# Altium integrated library komponenty_ITS_v1.IntLib: 126 symbols (continued)
## LED_0603_BLUE_A001 (continued)

## LED_0603_GREEN_A001
designator D?, comment GR
LED 0603 Green , regular; ITSN: LED_0603_GREEN_A001
footprint 0603_LED_GR (0603 LED Green)
pins: 1 A, 2 K

## LED_0603_RED_A001
designator D?, comment RD
LED 0603 Red , regular; ITSN: LED_0603_RED_A001
footprint 0603_LED_RD (0603 LED Red)
pins: 1 A, 2 K

## LED_0603_YELLOW_A001
designator D?, comment YG
LED 0603 Yellow , regular; ITSN: LED_0603_YELLOW_A001
footprint 0603_LED_YE (0603 LED Yellow)
pins: 1 A, 2 K

## LED_1206_RED_BV_A001
designator D?, comment RD
LED 0603 Red , regular; ITSN: nn
footprint 1206_LED_BV_RD (1206 LED Red bottom viev)
pins: 1 A, 2 K

## LIS2DW_A001
designator U?, comment LIS2DW
ITSN: IC_LIS2HH_LGA12_A001
footprint LGA-12 (LGA, 12-Leads, Body 2,00x2,00mmx0,70mm, Pitch 0,50mm)
pins: 1 SCL/SPC (in), 2 CS (in), 3 SDO/SA0 (io), 4 SDA/SDI/SDO (io), 5 NC, 6 GND (power), 7 RES, 8 GND (power), 9 VDD (power), 10 VDD_IO (power), 11 INT2 (io), 12 INT1 (out)

## LITTELFUSE_GS_NTC_V1
designator R?, comment NTC
ITSN: nn
footprint LittelFuse_GS_V_4mm_v 1 (NTC glass drop)
footprint LittelFuse_GS_V_4mm_v2 (NTC glass drop)
pins: 1, 2
text: C

## LM5022MM
designator U?, comment LM5022
boost converter
pins: 1 VIN (power), 2 FB (in), 3 COMP, 4 VCC (power), 5 OUT (out), 6 GND (power), 7 UVLO (in), 8 CS (in), 9 RT/SYN, 10 SS

## LMR36006
designator U?
60V 0A6 synchronus step-down converter; ITSN: LMR36006_A001
footprint VQFN-HR-12 (TI VQFN-HR-12)
pins: 1 PGND (power), 2 VIN (power), 4 BOOT, 5 VCC (out), 6 AGND (power), 7 FB (in), 8 PG (out), 9 EN (in), 10 VIN (power), 11 PGND (power), 12 SW

## LMV324_TSSOP14_A001
designator U?, comment LMV324
4 x OpAmp R/R 1MHz; ITSN: IC_LMV324_TSSOP14_A001
footprint TSSOP-14
part A pins: 1 OUT (out), 2 - (in), 3 + (in)
part B pins: 5 + (in), 6 - (in), 7 OUT (out)
part C pins: 8 OUT (out), 9 - (in), 10 + (in)
part D pins: 12 + (in), 13 - (in), 14 OUT (out)
part E pins: 4 V+ (power), 11 V-

## LMV358ID_SOIC8_A001
designator U?, comment LMV358
Low cost, low power, input/output rail-to-rail operational / amplifiers; ITSN: IC_LMV358ID_SOIC8_A001
footprint SO-8
part A pins: 1 1OUT (out), 2 1IN- (in), 3 1IN+ (in)
part B pins: 5 1IN+ (in), 6 1IN- (in), 7 1OUT (out)
part C pins: 4 V-, 8 V+ (power)

## M66
designator MOD?
Quectel M66; ITSN: MOD_GSM_M66_A001
footprint M66
pins: 1 AGNE (power), 2 SPK2P (out), 3 MICP (in), 4 MICN (in), 5 SPK1P (out), 6 SPK1N (out), 7 PWRKEY (in), 8 AVDD (power), 9 ADC0 (in), 10 SIM_GND (power), 11 SIM_DATA (io), 12 SIM_RST (out), 13 SIM_CLK (out), 14 SIM_VDD (power), 16 NET_LED (out), 17 TxD (out), 18 RxD (in), 19 DTR (in), 20 RI (out), 21 DCD (out), 22 CTS (out), 23 RTS (in), 24 VDDEXT (power), 25 RFTXMON (out), 26 BT_ANT, 27 GND (power), 28 RxD_AUX (in), 29 TxD_AUX (out), 30 PCM_CLK (out), 31 PCM_SYNC (out), 32 PCM_IN (in), 33 PCM_OUT (out), 34 GND (power), 35 RF_ANT, 36 GND (power), 37 GND (power), 38 DBG_RxD (in), 39 DBG_TxD (out), 40 GND (power), 41 GND (power), 42 VBAT (power), 43 VBAT (power), 44 VRTC (power)

## MAA8652_A001
designator U?, comment MAA8652
ITSN: IC_KX003_LGA12_A001
footprint DFN-10_ACC (PQFN, 10-Leads, Body 2,00x2,00mm, Pitch 0,40mm, Thermal Pad 0,50x0,50mm, IPC Medium Density)
pins: 1 VDD (power), 2 SCL (in), 3 INT1 (out), 4 BYP, 5 INT2 (out), 6 GND (power), 7 GND (power), 8 VDD_IO (power), 9 GND (power), 10 SDA (io)

## MCP1416T_SOT23_A001
designator U?, comment MCP1416T
High speed power MOSFET driver; ITSN: IC_MCP1416_SOT23_A001
footprint SOT-23-5
pins: 1 NC, 2 VDD (power), 3 IN (in), 4 GND (power), 5 OUT (out)

## MCP1703A_REG_3V3_A001
designator U?, comment MCP1703A
LDO Vdrop<600mV, SOT-223, 500mA, Iq = 2uA; ITSN: IC_SPX3819_SOT23-5_A001
footprint SOT-223
pins: 1 Vin, 2 GND, 3 Vout

## MCP73811/2
designator U?, comment MCP73812
single cell Li-Ion Li-Poly linear baterry charger; ITSN: IC_MCP73812_SOT23-5_A001
footprint SOT-23-5
pins: 1 CE (in), 2 VSS (power), 3 VBAT, 4 VDD (power), 5 PROG

## MCP73831
designator U?
500 mA Li-Ion Battery Charge; ITSN: IC_MCP73831_SOT23-5_A001
footprint SOT-23-5
pins: 1 STAT (out), 2 GND (power), 3 VBAT (out), 4 VDD (power), 5 PROG

## MIC5504_SOT23-5_A001
designator U?, comment MIC5504-3.3
Multi komponent 2.2-3.3 V 100mA Iq<65uA; ITSN: IC_LIN_REG_MULTI_SOT23-5_A001
footprint SOT-23-5
pins: 1 VIN (power), 2 GND (power), 3 EN (power), 4 NC, 5 VOUT (power)

## NE555
designator U?
ITSN: IC_NE555_SO8_A001
footprint SO-8
pins: 1 GND (power), 2 TRIG (in), 3 OUT (out), 4 RST (in), 5 CONT, 6 THRES (in), 7 DISCH (oc), 8 VDD (power)

## OSC_MEMS_2.5_2.0_A001
designator OSC?, comment MEMS OSC
ITSN: MEMS_OSC_8MHZ_A001
footprint MEMS_OSC_2.5_3-2_2.5_v1 (mems oscilator 2.5x2 or 3.2x2.5)
pins: 1 OE (in), 2 GND (power), 3 OUT (out), 4 VDD (power)

## PC357Z
designator U?
ITSN: OCT_PC357_SMD_A001
footprint Mini-Flat_4
pins: 1 A, 2 K, 3 E, 4 C

## PIN_HEADER_1x2_2_54mm_THT_A001
designator CON?, comment PIN_HEADER 1x2 2,54mm
footprint PIN_HEADER_1x2_2.54_THT_A001
pins: 1, 2

## PIN_HEADER_1x2_2mm_THT_A001
designator CON?, comment PIN_HEADER 1x2 2mm
footprint PIN_HEADER_1x2_2_THT_A001
pins: 1, 2

## Si8662xx-x-IS
designator U?
ITSN: IC_SI8662_SOIC16_A001
footprint SOIC-16 (SOIC, 16-Leads, Body 10,0x4,0mm (max), Pitch 1,27mm, IPC Low Density)
pins: 1 VDD1 (power), 2 A1 (in), 3 A2 (in), 4 A3 (in), 5 A4 (in), 6 A5 (out), 7 A6 (out), 8 GND1 (power), 9 GND2 (power), 10 B6 (in), 11 B5 (in), 12 B4 (out), 13 B3 (out), 14 B2 (out), 15 B1 (out), 16 VDD2 (power)

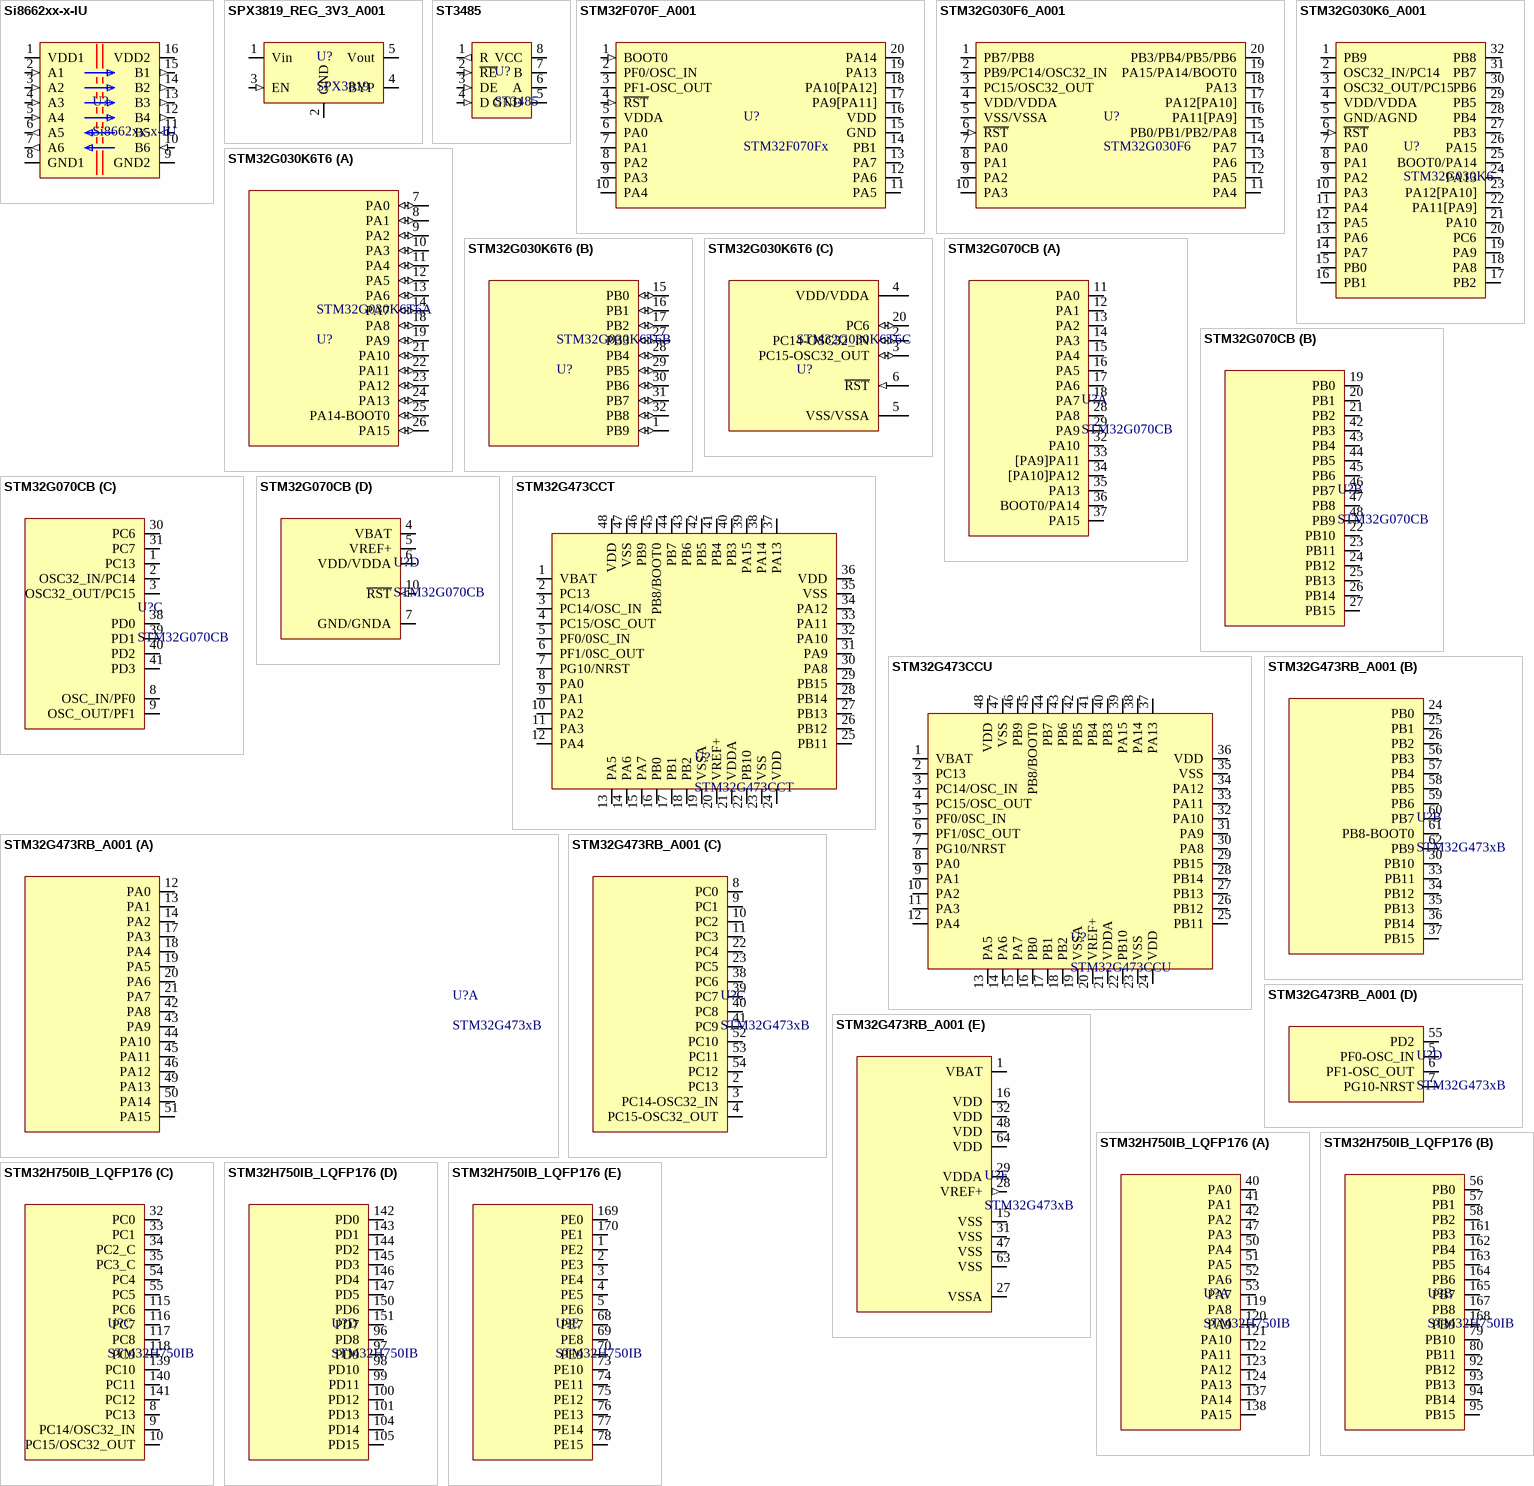
[diagram p3: symbols Si8662xx-x-IU to STM32H750IB_LQFP176]

## Si8662xx-x-IU
designator U?
ITSN: IC_SI8662_SO16_A001
footprint SO-16-W
pins: 1 VDD1 (power), 2 A1 (in), 3 A2 (in), 4 A3 (in), 5 A4 (in), 6 A5 (out), 7 A6 (out), 8 GND1 (power), 9 GND2 (power), 10 B6 (in), 11 B5 (in), 12 B4 (out), 13 B3 (out), 14 B2 (out), 15 B1 (out), 16 VDD2 (power)

## SPX3819_REG_3V3_A001
designator U?, comment SPX3819
LDO Vdrop<600mV, SOT23-5, 500mA; ITSN: IC_SPX3819_SOT23-5_A001
footprint SOT-23-5
pins: 1 Vin, 2 GND, 3 EN (in), 4 BYP, 5 Vout

## ST3485
designator U?
ST3485 3V3; ITSN: IC_ST3485_SO-8_A001
footprint SO-8
pins: 1 R (out), 2 ~{RE} (in), 3 DE (in), 4 D (in), 5 GND (power), 6 A, 7 B, 8 VCC (power)

## STM32F070F_A001
designator U?, comment STM32F070Fx
STM32F070Fx TSSOP20 32k/6k; ITSN: *
footprint TSSOP-20
pins: 1 BOOT0 (in), 2 PF0/OSC_IN (io), 3 PF1-OSC_OUT (io), 4 ~{RST} (in), 5 VDDA (power), 6 PA0 (io), 7 PA1 (io), 8 PA2 (io), 9 PA3 (io), 10 PA4 (io), 11 PA5 (io), 12 PA6 (io), 13 PA7 (io), 14 PB1 (io), 15 GND (power), 16 VDD (power), 17 PA9[PA11] (io), 18 PA10[PA12] (io), 19 PA13 (io), 20 PA14 (io)

## STM32G030F6_A001
designator U?, comment STM32G030F6
STN32G030F6 TSSOP20 32k/8k; ITSN: *
footprint TSSOP-20
pins: 1 PB7/PB8 (io), 2 PB9/PC14/OSC32_IN (io), 3 PC15/OSC32_OUT (io), 4 VDD/VDDA (power), 5 VSS/VSSA (power), 6 ~{RST} (in), 7 PA0 (io), 8 PA1 (io), 9 PA2 (io), 10 PA3 (io), 11 PA4 (io), 12 PA5 (io), 13 PA6 (io), 14 PA7 (io), 15 PB0/PB1/PB2/PA8 (io), 16 PA11[PA9] (io), 17 PA12[PA10] (io), 18 PA13 (io), 19 PA15/PA14/BOOT0 (io), 20 PB3/PB4/PB5/PB6 (io)

## STM32G030K6_A001
designator U?, comment STM32G030K6
STM32G030K6 32k/8k 32pin; ITSN: IC_STM32G030K6_LQFP32_A001
footprint LQFP32_A002 (TQFP, 32-Leads, Body 7,00x7,00mm, Pitch 0,80mm, IPC Low Density)
pins: 1 PB9 (io), 2 OSC32_IN/PC14 (io), 3 OSC32_OUT/PC15 (io), 4 VDD/VDDA (power), 5 GND/AGND (power), 6 ~{RST} (in), 7 PA0 (io), 8 PA1 (io), 9 PA2 (io), 10 PA3 (io), 11 PA4 (io), 12 PA5 (io), 13 PA6 (io), 14 PA7 (io), 15 PB0 (io), 16 PB1 (io), 17 PB2 (io), 18 PA8 (io), 19 PA9 (io), 20 PC6 (io), 21 PA10 (io), 22 PA11[PA9] (io), 23 PA12[PA10] (io), 24 PA13 (io), 25 BOOT0/PA14 (io), 26 PA15 (io), 27 PB3 (io), 28 PB4 (io), 29 PB5 (io), 30 PB6 (io), 31 PB7 (io), 32 PB8 (io)

## STM32G030K6T6
designator STM32G030K6T6, comment U?
Flash: 32kB; 64MHz; SRAM: 8kB; LQFP32; 2÷3,6VDC; ITSN: IC_STM32G030K6_LQFP32_A001
footprint LQFP32 (TQFP, 32-Leads, Body 7,00x7,00mm, Pitch 0,80mm, IPC Low Density)
part A pins: 7 PA0 (io), 8 PA1 (io), 9 PA2 (io), 10 PA3 (io), 11 PA4 (io), 12 PA5 (io), 13 PA6 (io), 14 PA7 (io), 18 PA8 (io), 19 PA9 (io), 21 PA10 (io), 22 PA11 (io), 23 PA12 (io), 24 PA13 (io), 25 PA14-BOOT0 (io), 26 PA15 (io)
part B pins: 1 PB9 (io), 15 PB0 (io), 16 PB1 (io), 17 PB2 (io), 27 PB3 (io), 28 PB4 (io), 29 PB5 (io), 30 PB6 (io), 31 PB7 (io), 32 PB8 (io)
part C pins: 2 PC14-OSC32_IN (io), 3 PC15-OSC32_OUT (io), 4 VDD/VDDA (power), 5 VSS/VSSA (power), 6 ~{RST} (in), 20 PC6 (io)

## STM32G070CB
designator U?
ITSN: *
footprint LQFP48
part A pins: 11 PA0 (io), 12 PA1 (io), 13 PA2 (io), 14 PA3 (io), 15 PA4 (io), 16 PA5 (io), 17 PA6 (io), 18 PA7 (io), 28 PA8 (io), 29 PA9 (io), 32 PA10 (io), 33 [PA9]PA11 (io), 34 [PA10]PA12 (io), 35 PA13 (io), 36 BOOT0/PA14 (io), 37 PA15 (io)
part B pins: 19 PB0 (io), 20 PB1 (io), 21 PB2 (io), 22 PB10 (io), 23 PB11 (io), 24 PB12 (io), 25 PB13 (io), 26 PB14 (io), 27 PB15 (io), 42 PB3 (io), 43 PB4 (io), 44 PB5 (io), 45 PB6 (io), 46 PB7 (io), 47 PB8 (io), 48 PB9 (io)
part C pins: 1 PC13 (io), 2 OSC32_IN/PC14 (io), 3 OSC32_OUT/PC15 (io), 8 OSC_IN/PF0 (io), 9 OSC_OUT/PF1 (io), 30 PC6 (io), 31 PC7 (io), 38 PD0 (io), 39 PD1 (io), 40 PD2 (io), 41 PD3 (io)
part D pins: 4 VBAT (power), 5 VREF+ (power), 6 VDD/VDDA (power), 7 GND/GNDA (power), 10 ~{RST} (in)

## STM32G473CCT
designator U?
pins: 1 VBAT (power), 2 PC13 (io), 3 PC14/OSC_IN (io), 4 PC15/OSC_OUT (io), 5 PF0/0SC_IN (io), 6 PF1/0SC_OUT (io), 7 PG10/NRST (io), 8 PA0 (io), 9 PA1 (io), 10 PA2 (io), 11 PA3 (io), 12 PA4 (io), 13 PA5 (io), 14 PA6 (io), 15 PA7 (io), 16 PB0 (io), 17 PB1 (io), 18 PB2 (io), 19 VSSA (power), 20 VREF+ (power), 21 VDDA (power), 22 PB10 (io), 23 VSS (power), 24 VDD (power), 25 PB11 (io), 26 PB12 (io), 27 PB13 (io), 28 PB14 (io), 29 PB15 (io), 30 PA8 (io), 31 PA9 (io), 32 PA10 (io), 33 PA11 (io), 34 PA12 (io), 35 VSS (power), 36 VDD (power), 37 PA13 (io), 38 PA14 (io), 39 PA15 (io), 40 PB3 (io), 41 PB4 (io), 42 PB5 (io), 43 PB6 (io), 44 PB7 (io), 45 PB8/BOOT0 (io), 46 PB9 (io), 47 VSS (power), 48 VDD (power)

## STM32G473CCU
designator U?
footprint LQFP48
pins: 1 VBAT (power), 2 PC13 (io), 3 PC14/OSC_IN (io), 4 PC15/OSC_OUT (io), 5 PF0/0SC_IN (io), 6 PF1/0SC_OUT (io), 7 PG10/NRST (io), 8 PA0 (io), 9 PA1 (io), 10 PA2 (io), 11 PA3 (io), 12 PA4 (io), 13 PA5 (io), 14 PA6 (io), 15 PA7 (io), 16 PB0 (io), 17 PB1 (io), 18 PB2 (io), 19 VSSA (power), 20 VREF+ (power), 21 VDDA (power), 22 PB10 (io), 23 VSS (power), 24 VDD (power), 25 PB11 (io), 26 PB12 (io), 27 PB13 (io), 28 PB14 (io), 29 PB15 (io), 30 PA8 (io), 31 PA9 (io), 32 PA10 (io), 33 PA11 (io), 34 PA12 (io), 35 VSS (power), 36 VDD (power), 37 PA13 (io), 38 PA14 (io), 39 PA15 (io), 40 PB3 (io), 41 PB4 (io), 42 PB5 (io), 43 PB6 (io), 44 PB7 (io), 45 PB8/BOOT0 (io), 46 PB9 (io), 47 VSS (power), 48 VDD (power)

## STM32G473RB_A001
designator U?, comment STM32G473xB
ITSN: IC_STM32G473RB_A001
footprint LQFP64 (TSQFP, 64-Leads, Body 10,00x10,00mm, Pitch 0,50mm)
part A pins: 12 PA0 (io), 13 PA1 (io), 14 PA2 (io), 17 PA3 (io), 18 PA4 (io), 19 PA5 (io), 20 PA6 (io), 21 PA7 (io), 42 PA8 (io), 43 PA9 (io), 44 PA10 (io), 45 PA11 (io), 46 PA12 (io), 49 PA13 (io), 50 PA14 (io), 51 PA15 (io)
part B pins: 24 PB0 (io), 25 PB1 (io), 26 PB2 (io), 30 PB10 (io), 33 PB11 (io), 34 PB12 (io), 35 PB13 (io), 36 PB14 (io), 37 PB15 (io), 56 PB3 (io), 57 PB4 (io), 58 PB5 (io), 59 PB6 (io), 60 PB7 (io), 61 PB8-BOOT0 (io), 62 PB9 (io)
part C pins: 2 PC13 (io), 3 PC14-OSC32_IN (io), 4 PC15-OSC32_OUT (io), 8 PC0 (io), 9 PC1 (io), 10 PC2 (io), 11 PC3 (io), 22 PC4 (io), 23 PC5 (io), 38 PC6 (io), 39 PC7 (io), 40 PC8 (io), 41 PC9 (io), 52 PC10 (io), 53 PC11 (io), 54 PC12 (io)
part D pins: 5 PF0-OSC_IN (io), 6 PF1-OSC_OUT (io), 7 PG10-NRST (io), 55 PD2 (io)
part E pins: 1 VBAT (power), 15 VSS (power), 16 VDD (power), 27 VSSA (power), 28 VREF+ (out), 29 VDDA (power), 31 VSS (power), 32 VDD (power), 47 VSS (power), 48 VDD (power), 63 VSS (power), 64 VDD (power)

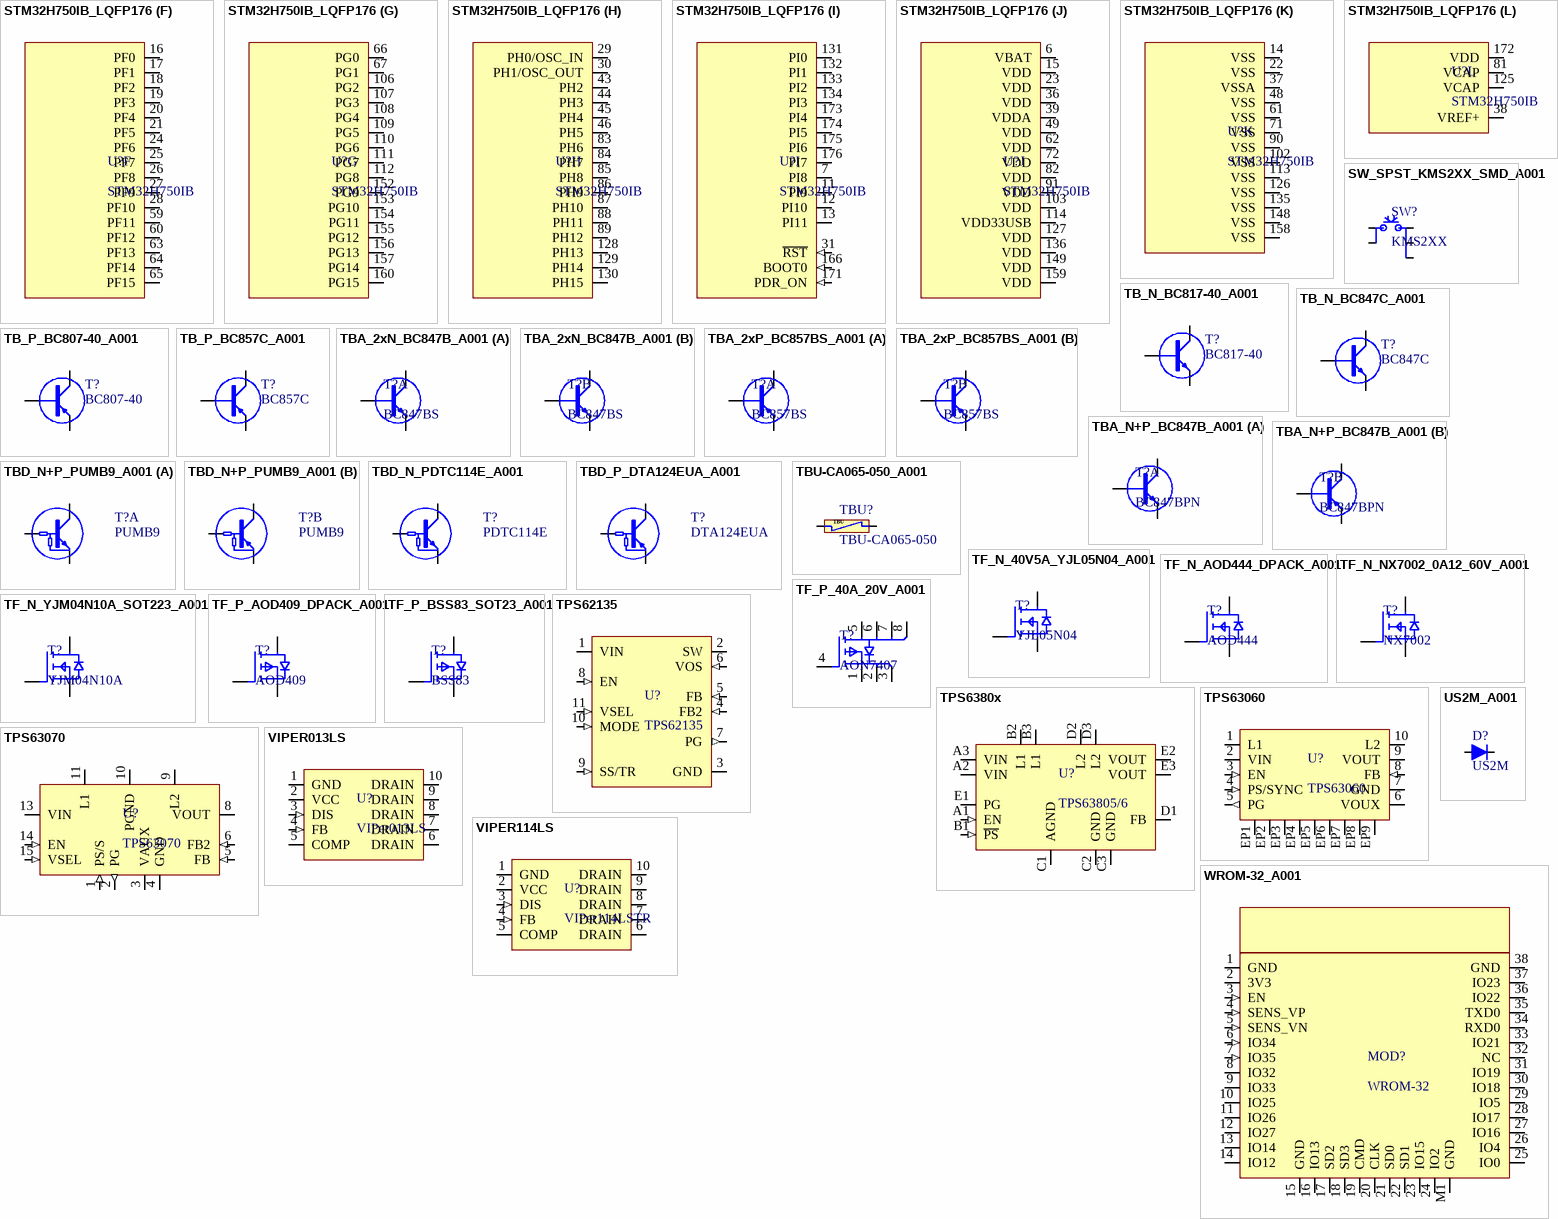
[diagram p4: symbols STM32H750IB_LQFP176 to WROM-32_A001]

## STM32H750IB_LQFP176
designator U?, comment STM32H750IB
STM32H750IB LQFP176; ITSN: IC_STM32H750IB_LQFP176_A001
footprint LQFP176
part A pins: 40 PA0 (io), 41 PA1 (io), 42 PA2 (io), 47 PA3 (io), 50 PA4 (io), 51 PA5 (io), 52 PA6 (io), 53 PA7 (io), 119 PA8 (io), 120 PA9 (io), 121 PA10 (io), 122 PA11 (io), 123 PA12 (io), 124 PA13 (io), 137 PA14 (io), 138 PA15 (io)
part B pins: 56 PB0 (io), 57 PB1 (io), 58 PB2 (io), 79 PB10 (io), 80 PB11 (io), 92 PB12 (io), 93 PB13 (io), 94 PB14 (io), 95 PB15 (io), 161 PB3 (io), 162 PB4 (io), 163 PB5 (io), 164 PB6 (io), 165 PB7 (io), 167 PB8 (io), 168 PB9 (io)
part C pins: 8 PC13 (io), 9 PC14/OSC32_IN (io), 10 PC15/OSC32_OUT (io), 32 PC0 (io), 33 PC1 (io), 34 PC2_C (io), 35 PC3_C (io), 54 PC4 (io), 55 PC5 (io), 115 PC6 (io), 116 PC7 (io), 117 PC8 (io), 118 PC9 (io), 139 PC10 (io), 140 PC11 (io), 141 PC12 (io)
part D pins: 96 PD8 (io), 97 PD9 (io), 98 PD10 (io), 99 PD11 (io), 100 PD12 (io), 101 PD13 (io), 104 PD14 (io), 105 PD15 (io), 142 PD0 (io), 143 PD1 (io), 144 PD2 (io), 145 PD3 (io), 146 PD4 (io), 147 PD5 (io), 150 PD6 (io), 151 PD7 (io)
part E pins: 1 PE2 (io), 2 PE3 (io), 3 PE4 (io), 4 PE5 (io), 5 PE6 (io), 68 PE7 (io), 69 PE8 (io), 70 PE9 (io), 73 PE10 (io), 74 PE11 (io), 75 PE12 (io), 76 PE13 (io), 77 PE14 (io), 78 PE15 (io), 169 PE0 (io), 170 PE1 (io)
part F pins: 16 PF0 (io), 17 PF1 (io), 18 PF2 (io), 19 PF3 (io), 20 PF4 (io), 21 PF5 (io), 24 PF6 (io), 25 PF7 (io), 26 PF8 (io), 27 PF9 (io), 28 PF10 (io), 59 PF11 (io), 60 PF12 (io), 63 PF13 (io), 64 PF14 (io), 65 PF15 (io)
part G pins: 66 PG0 (io), 67 PG1 (io), 106 PG2 (io), 107 PG3 (io), 108 PG4 (io), 109 PG5 (io), 110 PG6 (io), 111 PG7 (io), 112 PG8 (io), 152 PG9 (io), 153 PG10 (io), 154 PG11 (io), 155 PG12 (io), 156 PG13 (io), 157 PG14 (io), 160 PG15 (io)
part H pins: 29 PH0/OSC_IN (io), 30 PH1/OSC_OUT (io), 43 PH2 (io), 44 PH3 (io), 45 PH4 (io), 46 PH5 (io), 83 PH6 (io), 84 PH7 (io), 85 PH8 (io), 86 PH9 (io), 87 PH10 (io), 88 PH11 (io), 89 PH12 (io), 128 PH13 (io), 129 PH14 (io), 130 PH15 (io)
part I pins: 7 PI8 (io), 11 PI9 (io), 12 PI10 (io), 13 PI11 (io), 31 ~{RST} (in), 131 PI0 (io), 132 PI1 (io), 133 PI2 (io), 134 PI3 (io), 166 BOOT0 (in), 171 PDR_ON (in), 173 PI4 (io), 174 PI5 (io), 175 PI6 (io), 176 PI7 (io)
part J pins: 6 VBAT (power), 15 VDD (power), 23 VDD (power), 36 VDD (power), 39 VDDA (power), 49 VDD (power), 62 VDD (power), 72 VDD (power), 82 VDD (power), 91 VDD (power), 103 VDD (power), 114 VDD33USB (power), 127 VDD (power), 136 VDD (power), 149 VDD (power), 159 VDD (power)
part K pins: 14 VSS (power), 22 VSS (power), 37 VSSA (power), 48 VSS (power), 61 VSS (power), 71 VSS (power), 90 VSS (power), 102 VSS (power), 113 VSS (power), 126 VSS (power), 135 VSS (power), 148 VSS (power), 158 VSS (power)
part L pins: 38 VREF+, 81 VCAP, 125 VCAP, 172 VDD (power)

## SW_SPST_KMS2XX_SMD_A001
designator SW?, comment KMS2XX
microswitch kontowy SMT; ITSN: SW_SPST_KMS2XX_ANG_SMD_A001
footprint KMS_EVQP_A001 (microwsitch SMD angle)
pins: 1, 2, 3, 4, 5

## TB_N_BC817-40_A001
designator T?, comment BC817-40
NPN BC817-40; ITSN: TB_N_BC817-40_SOT23_A001
footprint SOT-23
pins: 1 B, 2 E, 3 C

## TB_N_BC847C_A001
designator T?, comment BC847C
NPN BC847C; ITSN: TB_N_BC847C_SOT323_A001
footprint SOT323
pins: 1 B, 2 E, 3 C

## TB_P_BC807-40_A001
designator T?, comment BC807-40
PNP BC807-40; ITSN: TB_P_BC807-40_SOT23_A001
footprint SOT-23
pins: 1 B, 2 E, 3 C

## TB_P_BC857C_A001
designator T?, comment BC857C
PNP BC857C; ITSN: TB_P_BC857C_SOT323_A001
footprint SOT323
pins: 1 B, 2 E, 3 C

## TBA_2xN_BC847B_A001
designator T?, comment BC847BS
BC847BS 2 x NPN; ITSN: TBA_2xN_BC847B_SOT363_A001
footprint SOT363
part A pins: 1 E1, 2 B1, 6 C1
part B pins: 3 C2, 4 E2, 5 B2

## TBA_2xP_BC857BS_A001
designator T?, comment BC857BS
BC857BS 2 x PNP; ITSN: TBA_2xP_BC857B_SOT363_A001
footprint SOT363
part A pins: 1 E1, 2 B1, 6 C1
part B pins: 3 C2, 4 E2, 5 B2

## TBA_N+P_BC847B_A001
designator T?, comment BC847BPN
BC847BPN  PNP + NPN; ITSN: TBA_N+P_BC847B_SOT363_A001
footprint SOT363
part A pins: 1 En, 2 Bn, 6 Cn
part B pins: 3 Cp, 4 Ep, 5 Bp

## TBD_N+P_PUMB9_A001
designator T?, comment PUMB9
NPN + PNP resistor-equipped transistors 4k7/10k SOT323; ITSN: TBD_N+P_PUMB9_SOT363_A001
footprint SOT363
part A pins: 1 E1, 2 B1, 6 C1
part B pins: 3 C2, 4 E2, 5 B2

## TBD_N_PDTC114E_A001
designator T?, comment PDTC114E
NPN resistor-equipped transistors 4k7/10k SOT323; ITSN: TBD_N_PDTC114Y_SOT323_A001
footprint SOT323
pins: 1 B, 2 E, 3 C

## TBD_P_DTA124EUA_A001
designator T?, comment DTA124EUA
PNP resistor-equipped transistors 22k/22k SOT323; ITSN: TBD_P_DTA124EUA_SOT323_A001
footprint SOT323
pins: 1 B, 2 E, 3 C

## TBU-CA065-050_A001
designator TBU?, comment TBU-CA065-050
TBU 650V 50mA; ITSN: TBU_CA065_050_A001
footprint TBU-CA_v1 (TBU single Bourns)
pins: 1, 3
text: TBU

## TF_N_40V5A_YJL05N04_A001
designator T?, comment YJL05N04
N-Channel 40-V 5A Lo VgsTH Sot23; ITSN: TF_N_40V_5A_SOT23_A001
footprint SOT-23
pins: 1 G, 2 S, 3 D

## TF_N_AOD444_DPACK_A001
designator T?, comment AOD444
60V/12A 60mOhmm DPACK; ITSN: TF_N_AOD444_DPACK_A001
footprint DPAK_v1 (D-PAK, 3-Pads, Body 6,20x6,72mm (max), IPC Low Density)
pins: 1 G, 2 D, 3 S

## TF_N_NX7002_0A12_60V_A001
designator T?, comment NX7002
MOSFET-N 120mA 60V SOT23; ITSN: TF_N_NX7002_0A12_60V_A001
footprint SOT-23
pins: 1 G, 2 S, 3 D

## TF_N_YJM04N10A_SOT223_A001
designator T?, comment YJM04N10A
100V/4A 120mOhmm @ 4V5; ITSN: TF_N_YJM04N10A_SOT223_A001
footprint SOT-223
pins: 1 G, 2 D, 3 S

## TF_P_40A_20V_A001
designator T?, comment AON7407
P-MOS 40A 20V Low Vgsth. AON7407; ITSN: TF_P_40A_20V_A001
footprint DFN_3x3_8_EP
pins: 1 S1, 2 S2, 3 S3, 4 G, 5 D1, 6 D2, 7 D3, 8 D4

## TF_P_AOD409_DPACK_A001
designator T?, comment AOD409
P-MOS 60V 26A 55mOhm DPACK; ITSN: TF_P_AOD409_DPACK_A001
footprint DPAK_v1 (D-PAK, 3-Pads, Body 6,20x6,72mm (max), IPC Low Density)
pins: 1 G, 2 D, 3 S

## TF_P_BSS83_SOT23_A001
designator T?, comment BSS83
P-MOS 60V 200mA 5Ohm SOT23; ITSN: TF_P_BSS83_SOT23_A001
footprint SOT-23
pins: 1 G, 2 S, 3 D

## TPS6380x
designator U?, comment TPS63805/6
Low Iq, Buck-Boost DC/DC Lo V
footprint DSBGA-15 (BGA, 15-Leads, Body 1,34x2,26mmx0,63mm, Pitch 0,40mm)
pins: A1 EN (in), A2 VIN (power), A3 VIN (power), B1 ~{PS} (in), B2 L1, B3 L1, C1 AGND (power), C2 GND (power), C3 GND (power), D1 FB, D2 L2, D3 L2, E1 PG (oe), E2 VOUT (power), E3 VOUT (power)

## TPS62135
designator U?
3-V to 17-V 4-A Step-Down Converters; ITSN: IC_TPS62135_A001
footprint VQFN-11 (3-V to 17-V 4-A Step-Down Converters)
pins: 1 VIN (power), 2 SW, 3 GND (power), 4 FB2 (in), 5 FB (in), 6 VOS (in), 7 PG (out), 8 EN (in), 9 SS/TR (in), 10 MODE (in), 11 VSEL (in)

## TPS63060
designator U?
Buck-Boost Converter With 2-A Switch Current vIN 2,5-12V; ITSN: IC_TPS63060_PWSON10_A001
footprint PWSON-10
pins: 1 L1, 2 VIN, 3 EN (in), 4 PS/SYNC (in), 5 PG (out), 6 VOUX, 7 GND, 8 FB (in), 9 VOUT, 10 L2, EP1, EP2, EP3, EP4, EP5, EP6, EP7, EP8, EP9

## TPS63070
designator U?
ITSN: IC_TPS63070_VQFN_A001
footprint VQFN-15 (TI VQFN power package)
pins: 1 PS/S (in), 2 PG (out), 3 VAUX, 4 GND, 5 FB (in), 6 FB2 (in), 8 VOUT, 9 L2, 10 PGND, 11 L1, 13 VIN, 14 EN (in), 15 VSEL (in)

## US2M_A001
designator D?, comment US2M
2A 1kV DO214AA 75ns; ITSN: DSW_2A_1kV_A001
footprint DO214AA
pins: 1 A, 2 K

## VIPER013LS
designator U?, comment VIPer013LS
VIPer01 AC/DC 360 mA 60kHz; ITSN: IC_VIPER013LS_SSOP10_A001
footprint SSOP-10 (st viper 11 series)
pins: 1 GND (power), 2 VCC (power), 3 DIS (in), 4 FB (in), 5 COMP, 6 DRAIN, 7 DRAIN, 8 DRAIN, 9 DRAIN, 10 DRAIN

## VIPER114LS
designator U?, comment VIPer114LSTR
VIPer11 AC/DC 480mA 60kHz; ITSN: IC_VIPER114L_SSOP10_A001
footprint SSOP-10 (st viper 11 series)
pins: 1 GND (power), 2 VCC (power), 3 DIS (in), 4 FB (in), 5 COMP, 6 DRAIN, 7 DRAIN, 8 DRAIN, 9 DRAIN, 10 DRAIN

## WROM-32_A001
designator MOD?, comment WROM-32
ITSN: MOD_WROM32_A001
footprint WROM-32
pins: 1 GND (power), 2 3V3 (power), 3 EN (in), 4 SENS_VP (in), 5 SENS_VN (in), 6 IO34 (in), 7 IO35 (in), 8 IO32 (io), 9 IO33 (io), 10 IO25 (io), 11 IO26 (io), 12 IO27 (io), 13 IO14 (io), 14 IO12 (io), 15 GND (power), 16 IO13 (io), 17 SD2 (io), 18 SD3 (io), 19 CMD (io), 20 CLK (io), 21 SD0 (io), 22 SD1 (io), 23 IO15 (io), 24 IO2 (io), 25 IO0 (io), 26 IO4 (io), 27 IO16 (io), 28 IO17 (io), 29 IO5 (io), 30 IO18 (io), 31 IO19 (io), 32 NC, 33 IO21 (io), 34 RXD0 (io), 35 TXD0 (io), 36 IO22 (io), 37 IO23 (io), 38 GND (power), M1 GND